# Altium footprint library Generic Footprint.PcbLib: 160 footprints (part 2 of 20)
Each footprint in its own frame and in the unit in brackets; x right, y up, seen from the top. Pads: shape width x height; smd on the part's side, far side on the other; paste and mask are expansions set on the pad; w line width, h text height; cw(c..) or ccw(c..) is an arc to the next point about the centre after c.
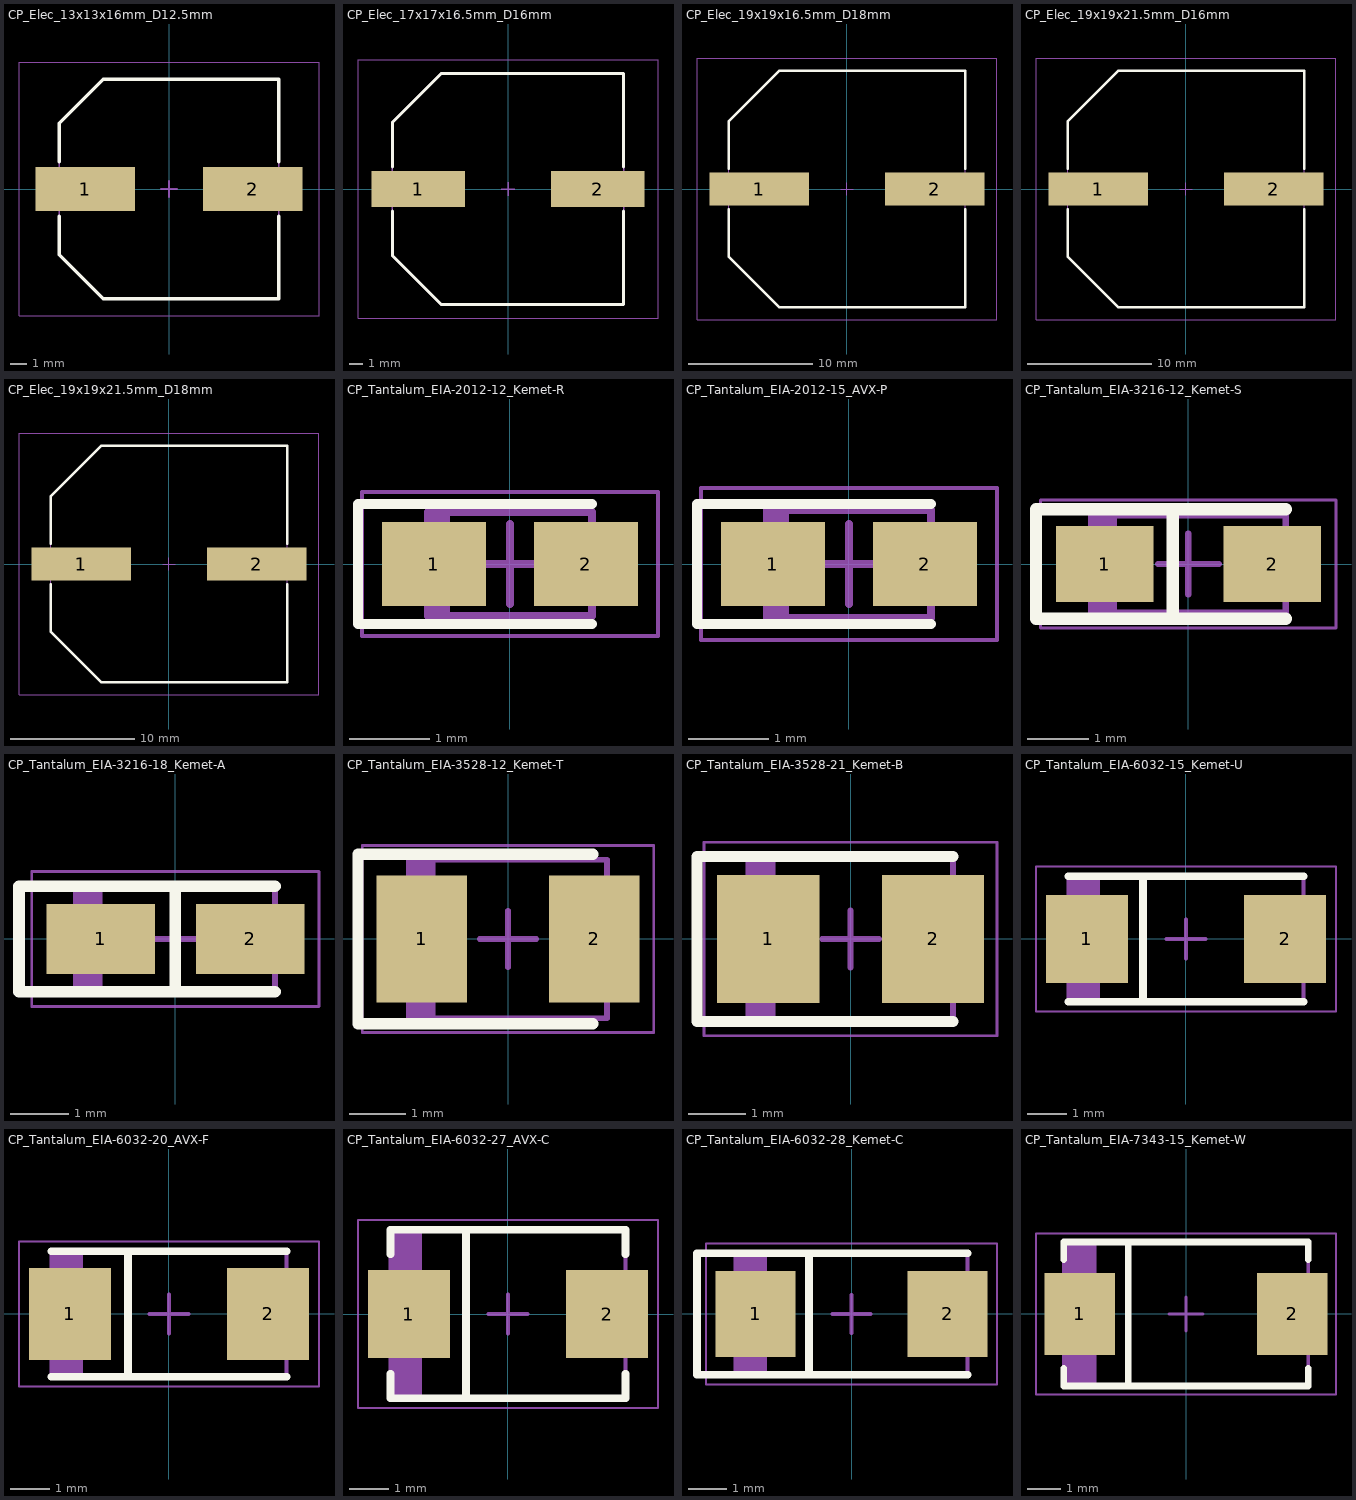
[diagram p1: the footprints below, top view; thin cyan lines are the x and y axes]

## CP_Elec_13x13x16mm_D12.5mm [mm] "Aluminum Electrolytic Capacitor, Body 13.00x13.00x16.00mm, IPC Low Density"
height 16
pads (2):
  rect 5.95x2.65 smd: 1(-5,0) 2(5,0)
Top Overlay:
  lines w0.2: -6.55,-1.625 -6.55,-3.937 -3.938,-6.55 6.55,-6.55 6.55,-1.625 ; -6.55,1.625 -6.55,3.938 -3.938,6.55 6.55,6.55 6.55,1.625
Courtyard Top:
  lines w0.05: -8.95,-7.55 8.95,-7.55 8.95,7.55 -8.95,7.55 -8.95,-7.55
  lines w0.1: -0.5,0 0.5,0 ; 0,-0.5 0,0.5
Assembly Top:
  lines w0.1: -6.55,-3.937 -6.55,3.938 -3.938,6.55 6.55,6.55 6.55,-6.55 -3.938,-6.55 -6.55,-3.937
3D body "CP_Elec_13x13x16mm.step": height 16, standoff 0, extent -6.85,-6.55 6.85,6.55

## CP_Elec_17x17x16.5mm_D16mm [mm] "Aluminum Electrolytic Capacitor, Body 17.00x17.00x16.50mm, IPC Low Density"
height 16.5
pads (2):
  rect 6.9x2.65 smd: 1(-6.65,0) 2(6.65,0)
Top Overlay:
  lines w0.2: -8.55,-1.625 -8.55,-4.937 -4.937,-8.55 8.55,-8.55 8.55,-1.625 ; -8.55,1.625 -8.55,4.938 -4.937,8.55 8.55,8.55 8.55,1.625
Courtyard Top:
  lines w0.05: -11.1,-9.55 -11.1,9.55 11.1,9.55 11.1,-9.55 -11.1,-9.55
  lines w0.1: -0.5,0 0.5,0 ; 0,-0.5 0,0.5
Assembly Top:
  lines w0.1: -8.55,-4.937 -4.937,-8.55 8.55,-8.55 8.55,8.55 -4.937,8.55 -8.55,4.938 -8.55,-4.937
3D body "CP_Elec_17x17x16.5mm.step": height 16.5, standoff 0, extent -9,-8.55 9,8.55

## CP_Elec_19x19x16.5mm_D18mm [mm] "Aluminum Electrolytic Capacitor, Body 19.00x19.00x16.50mm, IPC Low Density"
height 16.5
pads (2):
  rect 8.05x2.65 smd: 1(-7.075,0) 2(7.075,0)
Top Overlay:
  lines w0.2: -9.55,-1.625 -9.55,-5.437 -5.437,-9.55 9.55,-9.55 9.55,-1.625 ; -9.55,1.625 -9.55,5.437 -5.437,9.55 9.55,9.55 9.55,1.625
Courtyard Top:
  lines w0.05: -12.1,-10.55 -12.1,10.55 12.1,10.55 12.1,-10.55 -12.1,-10.55
  lines w0.1: -0.5,0 0.5,0 ; 0,-0.5 0,0.5
Assembly Top:
  lines w0.1: -9.55,-5.437 -5.437,-9.55 9.55,-9.55 9.55,9.55 -5.437,9.55 -9.55,5.437 -9.55,-5.437
3D body "CP_Elec_19x19x16.5mm_D18mm.step": height 16.5, standoff -1.5, extent -10,-9.55 10,9.55

## CP_Elec_19x19x21.5mm_D16mm [mm] "Aluminum Electrolytic Capacitor, Body 19.00x19.00x21.50mm, IPC Low Density"
height 21.5
pads (2):
  rect 8.05x2.65 smd: 1(-7.075,0) 2(7.075,0)
Top Overlay:
  lines w0.2: -9.55,-1.625 -9.55,-5.437 -5.437,-9.55 9.55,-9.55 9.55,-1.625 ; -9.55,1.625 -9.55,5.437 -5.437,9.55 9.55,9.55 9.55,1.625
Courtyard Top:
  lines w0.05: -12.1,-10.55 12.1,-10.55 12.1,10.55 -12.1,10.55 -12.1,-10.55
  lines w0.1: -0.5,0 0.5,0 ; 0,-0.5 0,0.5
Assembly Top:
  lines w0.1: -9.55,-5.437 -9.55,5.437 -5.437,9.55 9.55,9.55 9.55,-9.55 -5.437,-9.55 -9.55,-5.437
3D body: height 0.25, standoff 0, extent -10,-9.55 10,9.55

## CP_Elec_19x19x21.5mm_D18mm [mm] "Aluminum Electrolytic Capacitor, Body 19.00x19.00x21.50mm, IPC Low Density"
height 21.5
pads (2):
  rect 8.05x2.65 smd: 1(-7.075,0) 2(7.075,0)
Top Overlay:
  lines w0.2: -9.55,-1.625 -9.55,-5.437 -5.437,-9.55 9.55,-9.55 9.55,-1.625 ; -9.55,1.625 -9.55,5.437 -5.437,9.55 9.55,9.55 9.55,1.625
Courtyard Top:
  lines w0.05: -12.1,-10.55 12.1,-10.55 12.1,10.55 -12.1,10.55 -12.1,-10.55
  lines w0.1: -0.5,0 0.5,0 ; 0,-0.5 0,0.5
Assembly Top:
  lines w0.1: -9.55,-5.437 -9.55,5.437 -5.437,9.55 9.55,9.55 9.55,-9.55 -5.437,-9.55 -9.55,-5.437
3D body "CP_Elec_19x19x21.5mm_D18mm.step": height 21.5, standoff 0, extent -10,-9.55 10,9.55

## CP_Tantalum_EIA-2012-12_Kemet-R [mm] "Molded Tantalum Capacitor, 2-Leads, Body 2.05x1.30mm, IPC Medium Density"
height 1.5
pads (2):
  rect 1.3x1.05 smd: 1(-0.95,0) 2(0.95,0)
Top Overlay:
  lines w0.127: 1.025,-0.75 -1.9,-0.75 -1.9,0.75 1.025,0.75
Courtyard Top:
  lines w0.05: -1.85,-0.9 -1.85,0.9 1.85,0.9 1.85,-0.9 -1.85,-0.9
  lines w0.1: -0.5,0 0.5,0 ; 0,-0.5 0,0.5
Assembly Top:
  rectangle: -1.025,-0.65 -0.749,0.65
  lines w0.1: -1.025,-0.65 1.025,-0.65 1.025,0.65 -1.025,0.65 -1.025,-0.65
3D body "CP_EIA-2012-12_Kemet-R.step": height 1.5, standoff 0, extent -1.245,-0.65 1.245,0.65

## CP_Tantalum_EIA-2012-15_AVX-P [mm] "Molded Tantalum Capacitor, 2-Leads, Body 2.05x1.35mm, IPC Medium Density"
height 1.5
pads (2):
  rect 1.3x1.05 smd: 1(-0.95,0) 2(0.95,0)
Top Overlay:
  lines w0.127: 1.025,-0.75 -1.9,-0.75 -1.9,0.75 1.025,0.75
Courtyard Top:
  lines w0.05: -1.85,-0.95 -1.85,0.95 1.85,0.95 1.85,-0.95 -1.85,-0.95
  lines w0.1: -0.5,0 0.5,0 ; 0,-0.5 0,0.5
Assembly Top:
  rectangle: -1.025,-0.675 -0.749,0.675
  lines w0.1: -1.025,0.675 -1.025,-0.675 1.025,-0.675 1.025,0.675 ; -1.025,0.675 1.025,0.675
3D body "CP_EIA-2012-15_AVX-P.step": height 1.5, standoff 0, extent -1.245,-0.675 1.245,0.675

## CP_Tantalum_EIA-3216-12_Kemet-S [mm] "Molded Tantalum Capacitor, 2-Leads, Body 3.20x1.60mm, IPC Medium Density"
height 1.2
pads (2):
  rect 1.6x1.25 smd: 1(-1.375,0) 2(1.375,0)
Top Overlay:
  lines w0.2: -0.254,-0.889 -0.254,0.813 ; 1.6,-0.9 -2.5,-0.9 -2.5,0.9 1.6,0.9
Courtyard Top:
  lines w0.05: -2.425,-1.05 -2.425,1.05 2.425,1.05 2.425,-1.05 -2.425,-1.05
  lines w0.1: -0.5,0 0.5,0 ; 0,-0.5 0,0.5
Assembly Top:
  rectangle: -1.6,-0.8 -1.17,0.8
  lines w0.1: -1.6,-0.8 -1.6,0.8 1.6,0.8 1.6,-0.8 -1.6,-0.8
3D body "CP_EIA-3216-12_Kemet-S.step": height 1.2, standoff 0, extent -1.82,-0.8 1.82,0.8

## CP_Tantalum_EIA-3216-18_Kemet-A [mm] "Molded Tantalum Capacitor, 2-Leads, Body 3.20x1.60mm, IPC Medium Density"
height 1.6
pads (2):
  rect 1.85x1.2 smd: 1(-1.275,0) 2(1.275,0)
Top Overlay:
  lines w0.2: 0,-0.9 0,0.9 ; 1.7,-0.9 -1.7,-0.9 -2.667,-0.9 -2.667,0.9 -1.7,0.9 1.7,0.9
Courtyard Top:
  lines w0.05: -2.45,-1.15 -2.45,1.15 2.45,1.15 2.45,-1.15 -2.45,-1.15
  lines w0.1: -0.5,0 0.5,0 ; 0,-0.5 0,0.5
Assembly Top:
  rectangle: -1.7,-0.9 -1.243,0.9
  lines w0.1: -1.7,-0.9 -1.7,0.9 1.7,0.9 1.7,-0.9 -1.7,-0.9
3D body "CP_EIA-3216-18_Kemet-A.step": height 1.6, standoff 0, extent -1.92,-0.9 1.92,0.9

## CP_Tantalum_EIA-3528-12_Kemet-T [mm] "Molded Tantalum Capacitor, 2-Leads, Body 3.50x2.80mm, IPC Medium Density"
height 1.2
pads (2):
  rect 1.6x2.25 smd: 1(-1.525,0) 2(1.525,0)
Top Overlay:
  lines w0.2: 1.5,-1.5 -2.65,-1.5 -2.65,1.5 1.5,1.5
Courtyard Top:
  lines w0.05: -2.575,-1.65 2.575,-1.65 2.575,1.65 -2.575,1.65 ; -2.575,-1.65 -2.575,1.65
  lines w0.1: -0.5,0 0.5,0 ; 0,-0.5 0,0.5
Assembly Top:
  rectangle: -1.75,-1.4 -1.279,1.4
  lines w0.1: -1.75,-1.4 -1.75,1.4 1.75,1.4 1.75,-1.4 -1.75,-1.4
3D body "CP_EIA-3528-12_Kemet-T.step": height 1.2, standoff 0, extent -1.97,-1.4 1.97,1.4

## CP_Tantalum_EIA-3528-21_Kemet-B [mm] "Molded Tantalum Capacitor, 2-Leads, Body 3.50x2.80mm, IPC Medium Density"
height 1.9
pads (2):
  rect 1.8x2.25 smd: 1(-1.45,0) 2(1.45,0)
Top Overlay:
  lines w0.2: 1.8,-1.45 -1.8,-1.45 -2.7,-1.45 -2.7,1.45 -1.8,1.45 1.8,1.45 ; -2.575,-1.45 -2.575,-1.45
Courtyard Top:
  lines w0.05: -2.575,-1.7 2.575,-1.7 2.575,1.7 -2.575,1.7 -2.575,-1.7
  lines w0.1: -0.5,0 0.5,0 ; 0,-0.5 0,0.5
Assembly Top:
  rectangle: -1.8,-1.45 -1.316,1.45
  lines w0.1: -1.8,-1.45 1.8,-1.45 1.8,1.45 -1.8,1.45 -1.8,-1.45
3D body "CP_EIA-3528-21_Kemet-B.step": height 1.9, standoff 0, extent -2.02,-1.45 2.02,1.45

## CP_Tantalum_EIA-6032-15_Kemet-U [mm] "Molded Tantalum Capacitor, 2-Leads, Body 6.00x3.20mm, IPC Medium Density"
height 1.5
pads (2):
  rect 2.1x2.25 smd: 1(-2.525,0) 2(2.525,0)
Top Overlay:
  lines w0.2: -3,-1.6 3,-1.6 ; -3,1.6 3,1.6 ; -1.092,-1.549 -1.092,1.6
Courtyard Top:
  lines w0.05: -3.825,-1.85 -3.825,1.85 3.825,1.85 3.825,-1.85 -3.825,-1.85
  lines w0.1: -0.5,0 0.5,0 ; 0,-0.5 0,0.5
Assembly Top:
  rectangle: -3,-1.6 -2.193,1.6
  lines w0.1: -3,-1.6 -3,1.6 3,1.6 3,-1.6 -3,-1.6
3D body "CP_EIA-6032-15_Kemet-U.step": height 1.5, standoff 0, extent -3.22,-1.6 3.22,1.6

## CP_Tantalum_EIA-6032-20_AVX-F [mm] "Molded Tantalum Capacitor, 2-Leads, Body 7.30x4.30mm, IPC Medium Density"
height 3.2
pads (2):
  rect 2.1x2.35 smd: 1(-2.525,0) 2(2.525,0)
Top Overlay:
  lines w0.2: -3,-1.6 3,-1.6 ; -3,1.6 3,1.6 ; -1.041,-1.575 -1.041,1.6
Courtyard Top:
  lines w0.05: -3.825,-1.85 3.825,-1.85 3.825,1.85 -3.825,1.85 -3.825,-1.85
  lines w0.1: -0.5,0 0.5,0 ; 0,-0.5 0,0.5
Assembly Top:
  rectangle: -3,-1.6 -2.193,1.6
  lines w0.1: -3,-1.6 3,-1.6 3,1.6 -3,1.6 -3,-1.6
3D body "CP_EIA-6032-20_AVX-F.step": height 3.2, standoff 0, extent -3.22,-1.6 3.22,1.6

## CP_Tantalum_EIA-6032-27_AVX-C [mm] "Molded Tantalum Capacitor, 2-Leads, Body 6.00x4.30mm, IPC Medium Density"
height 2.5
pads (2):
  rect 2.1x2.25 smd: 1(-2.525,0) 2(2.525,0)
Top Overlay:
  lines w0.2: -3,-1.525 -3,-2.15 3,-2.15 3,-1.525 ; -3,1.525 -3,2.15 3,2.15 3,1.525 ; -1.067,-2.134 -1.067,2.108
Courtyard Top:
  lines w0.05: -3.825,-2.4 -3.825,2.4 3.825,2.4 3.825,-2.4 -3.825,-2.4
  lines w0.1: -0.5,0 0.5,0 ; 0,-0.5 0,0.5
Assembly Top:
  rectangle: -3,-2.15 -2.193,2.15
  lines w0.1: -3,-2.15 -3,2.15 3,2.15 3,-2.15 -3,-2.15
3D body "CP_EIA-6032-27_AVX-C.step": height 2.5, standoff 0, extent -3.22,-2.15 3.22,2.15

## CP_Tantalum_EIA-6032-28_Kemet-C [mm] "Molded Tantalum Capacitor, 2-Leads, Body 6.00x3.20mm, IPC Medium Density"
height 2.6
pads (2):
  rect 2.1x2.25 smd: 1(-2.525,0) 2(2.525,0)
Top Overlay:
  lines w0.2: -1.118,-1.575 -1.118,1.575 ; 3.05,-1.6 -3.05,-1.6 -4.064,-1.6 ; 3.05,1.6 -3.05,1.6 -4.064,1.6 -4.064,-1.6 ; -4.064,-1.6 -4.064,-1.6
Courtyard Top:
  lines w0.05: -3.825,-1.85 -3.825,1.85 3.825,1.85 3.825,-1.85 -3.825,-1.85
  lines w0.1: -0.5,0 0.5,0 ; 0,-0.5 0,0.5
Assembly Top:
  rectangle: -3.05,-1.6 -2.23,1.6
  lines w0.1: -3.05,-1.6 -3.05,1.6 3.05,1.6 3.05,-1.6 -3.05,-1.6
3D body "CP_EIA-6032-28_Kemet-C.step": height 2.6, standoff 0, extent -3.27,-1.6 3.27,1.6

## CP_Tantalum_EIA-7343-15_Kemet-W [mm] "Molded Tantalum Capacitor, 2-Leads, Body 7.30x4.30mm, IPC Medium Density"
height 1.5
pads (2):
  rect 2.1x2.45 smd: 1(-3.175,0) 2(3.175,0)
Top Overlay:
  lines w0.2: -3.65,-1.625 -3.65,-2.15 3.65,-2.15 3.65,-1.625 ; -3.65,1.625 -3.65,2.15 3.65,2.15 3.65,1.625 ; -1.727,-2.125 -1.727,2.134
Courtyard Top:
  lines w0.05: -4.475,-2.4 -4.475,2.4 4.475,2.4 4.475,-2.4 -4.475,-2.4
  lines w0.1: -0.5,0 0.5,0 ; 0,-0.5 0,0.5
Assembly Top:
  rectangle: -3.65,-2.15 -2.668,2.15
  lines w0.1: -3.65,-2.15 -3.65,2.15 3.65,2.15 3.65,-2.15 -3.65,-2.15
3D body "CP_EIA-7343-15_Kemet-W.step": height 1.5, standoff 0, extent -3.87,-2.15 3.87,2.15